# Altium footprint library Lib_001.PcbLib: 429 footprints (part 10 of 28)
Each footprint in its own frame and in the unit in brackets; x right, y up, seen from the top. Pads: shape width x height; smd on the part's side, far side on the other; paste and mask are expansions set on the pad; w line width, h text height; cw(c..) or ccw(c..) is an arc to the next point about the centre after c.
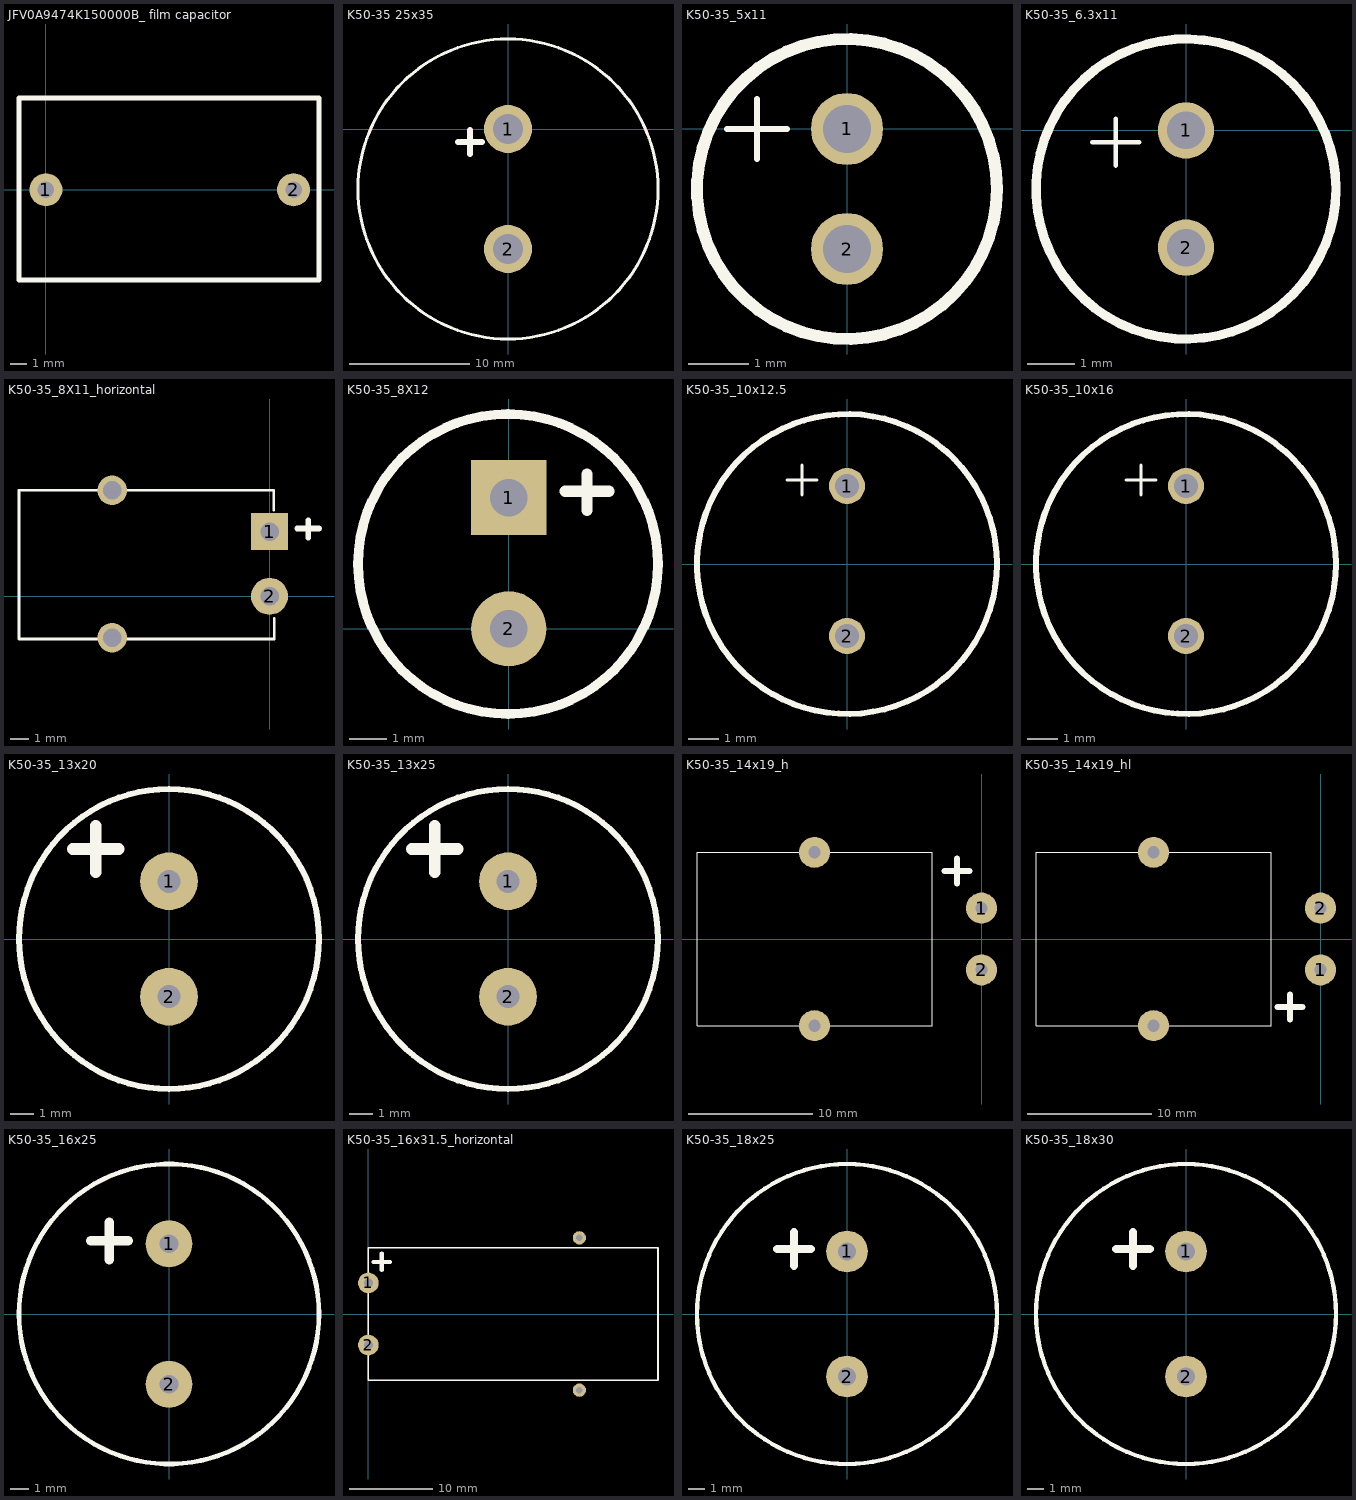
[diagram p9: the footprints below, top view; thin cyan lines are the x and y axes]

## JFV0A9474K150000B_ film capacitor [mm] "Interference Suppression Film Capacitor"
pads (2):
  round 2 hole 1: 1(0,0) 2(15,0)
Top Overlay:
  lines w0.3: -1.63,-5.46 16.54,-5.46 16.54,2.96 16.54,5.55 -1.63,5.55 -1.63,0.07 -1.63,-5.46
3D body: height 0, standoff -1, extent -0.397,-0.399 0.4,0.399
3D body: height 0, standoff -1, extent 14.603,-0.399 15.4,0.399
3D body: height 19, standoff 0, extent -1.63,-5.46 16.54,5.55

## K50-35 25x35 [mm]
pads (2):
  round 4 hole 2.5 unplated: 1(0,0) 2(0,-10)
Top Overlay:
  circle w0.254: c0,-5 r12.5
  lines w0.5: -4.18,-1.1 -2.18,-1.1 ; -3.18,-2.1 -3.18,-0.1
3D body "User Library-ECEC2DP271BJ.STEP": height 25, standoff 0, extent -11,-16 11,6

## K50-35_5x11 [mm]
height 11
pads (2):
  round 1.2 hole 0.8: 1(0,0) 2(0,-2)
Top Overlay:
  circle w0.2: c0,-1 r2.5
  lines w0.1: -2,0 -1,0 ; -1.5,-0.5 -1.5,0.5
3D body: height 1, standoff -2, extent -0.248,-0.249 0.25,0.25
3D body: height 1, standoff -2, extent -0.248,-2.249 0.25,-1.75
3D body: height 1, standoff 0, extent -2.48,-3.495 2.5,1.495
3D body: height 2, standoff 1, extent -1.984,-2.996 2,0.996
3D body: height 11, standoff 2, extent -2.48,-3.495 2.5,1.495
3D body: height 11.1, standoff 11, extent -1.984,-2.996 2,0.996

## K50-35_6.3x11 [mm]
height 11
pads (2):
  round 1.2 hole 0.8: 1(0,0) 2(0,-2.5)
Top Overlay:
  circle w0.2: c0,-1.25 r3.2
  lines w0.1: -2,-0.25 -1,-0.25 ; -1.5,-0.75 -1.5,0.25
3D body "User Library-Cap 6_3x11.STEP": height 11.5, standoff -18.5, extent -3.1,-4.4 3.2,1.9

## K50-35_8X11_horizontal [mm]
pads (4):
  rect 2x2 hole 1: 1(0,3.5)
  round 2 hole 1: 2(0,0)
  round 1.6 hole 1: ""(-8.517,-2.232) ""(-8.517,5.732)
Top Overlay:
  lines w0.15: 0.222,4.654 0.222,5.744 0.011,5.744 -13.557,5.744 -13.557,-2.31 0.024,-2.31 0.259,-2.31 0.259,-1.184
  lines w0.3: 1.505,3.67 2.675,3.67 ; 2.085,3.16 2.085,4.12
3D body "User Library-Cap electro 8x11_5x3_5mm RA.step": height 8.03, standoff -2, extent -13.557,-2.29 0.263,5.761

## K50-35_8X12 [mm]
pads (2):
  rect 2x2 hole 1: 1(0,3.5)
  round 2 hole 1: 2(0,0)
Top Overlay:
  circle w0.254: c-0.02,1.73 r4
  lines w0.3: 1.505,3.67 2.675,3.67 ; 2.085,3.16 2.085,4.12
3D body "SW3DPS-ELECTROLITIC CAPACITOR RADIAL 8X12-DEFAULT.STEP": height 12, standoff -2.5, extent -4.03,-2.3 3.97,5.7

## K50-35_10x12.5 [mm]
height 11
pads (2):
  round 1.2 hole 0.8: 1(0,2.6) 2(0,-2.4)
Top Overlay:
  circle w0.2: c0,0 r5
  lines w0.1: -2,2.8 -1,2.8 ; -1.5,2.3 -1.5,3.3
3D body "User Library-Cap-EL(10x12-5)T.step": height 12.5, standoff -3.5, extent -4.973,-4.992 5.013,5.01

## K50-35_10x16 [mm]
height 11
pads (2):
  round 1.2 hole 0.8: 1(0,2.6) 2(0,-2.4)
Top Overlay:
  circle w0.2: c0,0 r5
  lines w0.1: -2,2.8 -1,2.8 ; -1.5,2.3 -1.5,3.3
3D body "User Library-Cap 10x16.STEP": height 16.5, standoff -18.5, extent -4.98,-4.98 5.02,5.02

## K50-35_13x20 [mm]
height 25
pads (2):
  round 2.5 hole 1 unplated: 1(0,2.5) 2(0,-2.5)
Top Overlay:
  circle w0.254: c0,0 r6.5
  lines w0.5: -4.18,3.9 -2.18,3.9 ; -3.18,2.9 -3.18,4.9
3D body "User Library-Cap electrolitic radial 13x20.STEP": height 20.8, standoff -0.7, extent -6.47,-6.445 6.51,6.55

## K50-35_13x25 [mm]
height 25
pads (2):
  round 2.5 hole 1 unplated: 1(0,2.5) 2(0,-2.5)
Top Overlay:
  circle w0.254: c0,0 r6.5
  lines w0.5: -4.18,3.9 -2.18,3.9 ; -3.18,2.9 -3.18,4.9
3D body "User Library-Cap-EL(12_5x25-5)T.STEP": height 25.5, standoff -3.5, extent -6.237,-6.251 6.237,6.251

## K50-35_14x19_h [mm]
height 25
pads (4):
  round 2.5 hole 1 unplated: 1(0,2.5) 2(0,-2.5) ""(-13.5,-7) ""(-13.5,7)
Top Overlay:
  lines w0.1: -23,-7 -4,-7 -4,0 -4,7 -23,7 -23,0 -23,-7
  lines w0.5: -2.98,5.5 -0.98,5.5 ; -1.98,4.5 -1.98,6.5
3D body "User Library-Cap electrolitic radial 13x20.STEP": height 13, standoff 0, extent -22.975,-6.525 -1.475,6.47

## K50-35_14x19_hl [mm]
height 25
pads (4):
  round 2.5 hole 1 unplated: 1(0,-2.5) 2(0,2.5) ""(-13.5,-7) ""(-13.5,7)
Top Overlay:
  lines w0.1: -23,-7 -23,0 -23,7 -4,7 -4,0 -4,-7 -23,-7
  lines w0.5: -3.48,-5.5 -1.48,-5.5 ; -2.48,-6.5 -2.48,-4.5
3D body "User Library-Cap electrolitic radial 13x20.STEP": height 13, standoff 0, extent -22.975,-6.525 -1.475,6.47

## K50-35_16x25 [mm]
pads (2):
  round 2.5 hole 1 unplated: 1(0,3.75) 2(0,-3.75)
Top Overlay:
  circle w0.254: c0,0 r8
  lines w0.5: -4.18,3.9 -2.18,3.9 ; -3.18,2.9 -3.18,4.9
3D body "User Library-CE_R300_D650_H1000.step": height 26, standoff -2.9, extent -8.23,-8.25 8.231,8.233

## K50-35_16x31.5_horizontal [mm]
pads (4):
  round 2.5 hole 1.1 unplated: 1(0,3.75) 2(0,-3.75)
  round 1.6 hole 0.8 unplated: ""(25.5,-9.2) ""(25.5,9.2)
Top Overlay:
  lines w0.2: 0,-8.01 0,-3.75 0,3.75 0,8.01 35,8.01 35,-8.01 0,-8.01
  lines w0.5: 0.62,6.3 2.62,6.3 ; 1.62,5.3 1.62,7.3
3D body "User Library-CAPAER_D160_L315_P075_W008X030.STEP": height 16, standoff 0, extent 0.487,-8.015 35,7.995

## K50-35_18x25 [mm]
pads (2):
  round 2.5 hole 1.1 unplated: 1(0,3.75) 2(0,-3.75)
Top Overlay:
  circle w0.254: c0,0 r9
  lines w0.5: -4.18,3.9 -2.18,3.9 ; -3.18,2.9 -3.18,4.9
3D body "User Library-CAPAER_D180_L250_P075_W008X030.STEP": height 25.01, standoff -3, extent -9,-9.01 9,9

## K50-35_18x30 [mm]
height 30
pads (2):
  round 2.5 hole 1.1 unplated: 1(0,3.75) 2(0,-3.75)
Top Overlay:
  circle w0.254: c0,0 r9
  lines w0.5: -4.18,3.9 -2.18,3.9 ; -3.18,2.9 -3.18,4.9
3D body "User Library-CAPAER_D180_L300_P075_W008X030.STEP": height 30.01, standoff -3, extent -9,-9.01 9,9